# Altium footprint library standard.PcbLib: 235 footprints (part 11 of 15)
Each footprint in its own frame and in the unit in brackets; x right, y up, seen from the top. Pads: shape width x height; smd on the part's side, far side on the other; paste and mask are expansions set on the pad; w line width, h text height; cw(c..) or ccw(c..) is an arc to the next point about the centre after c.
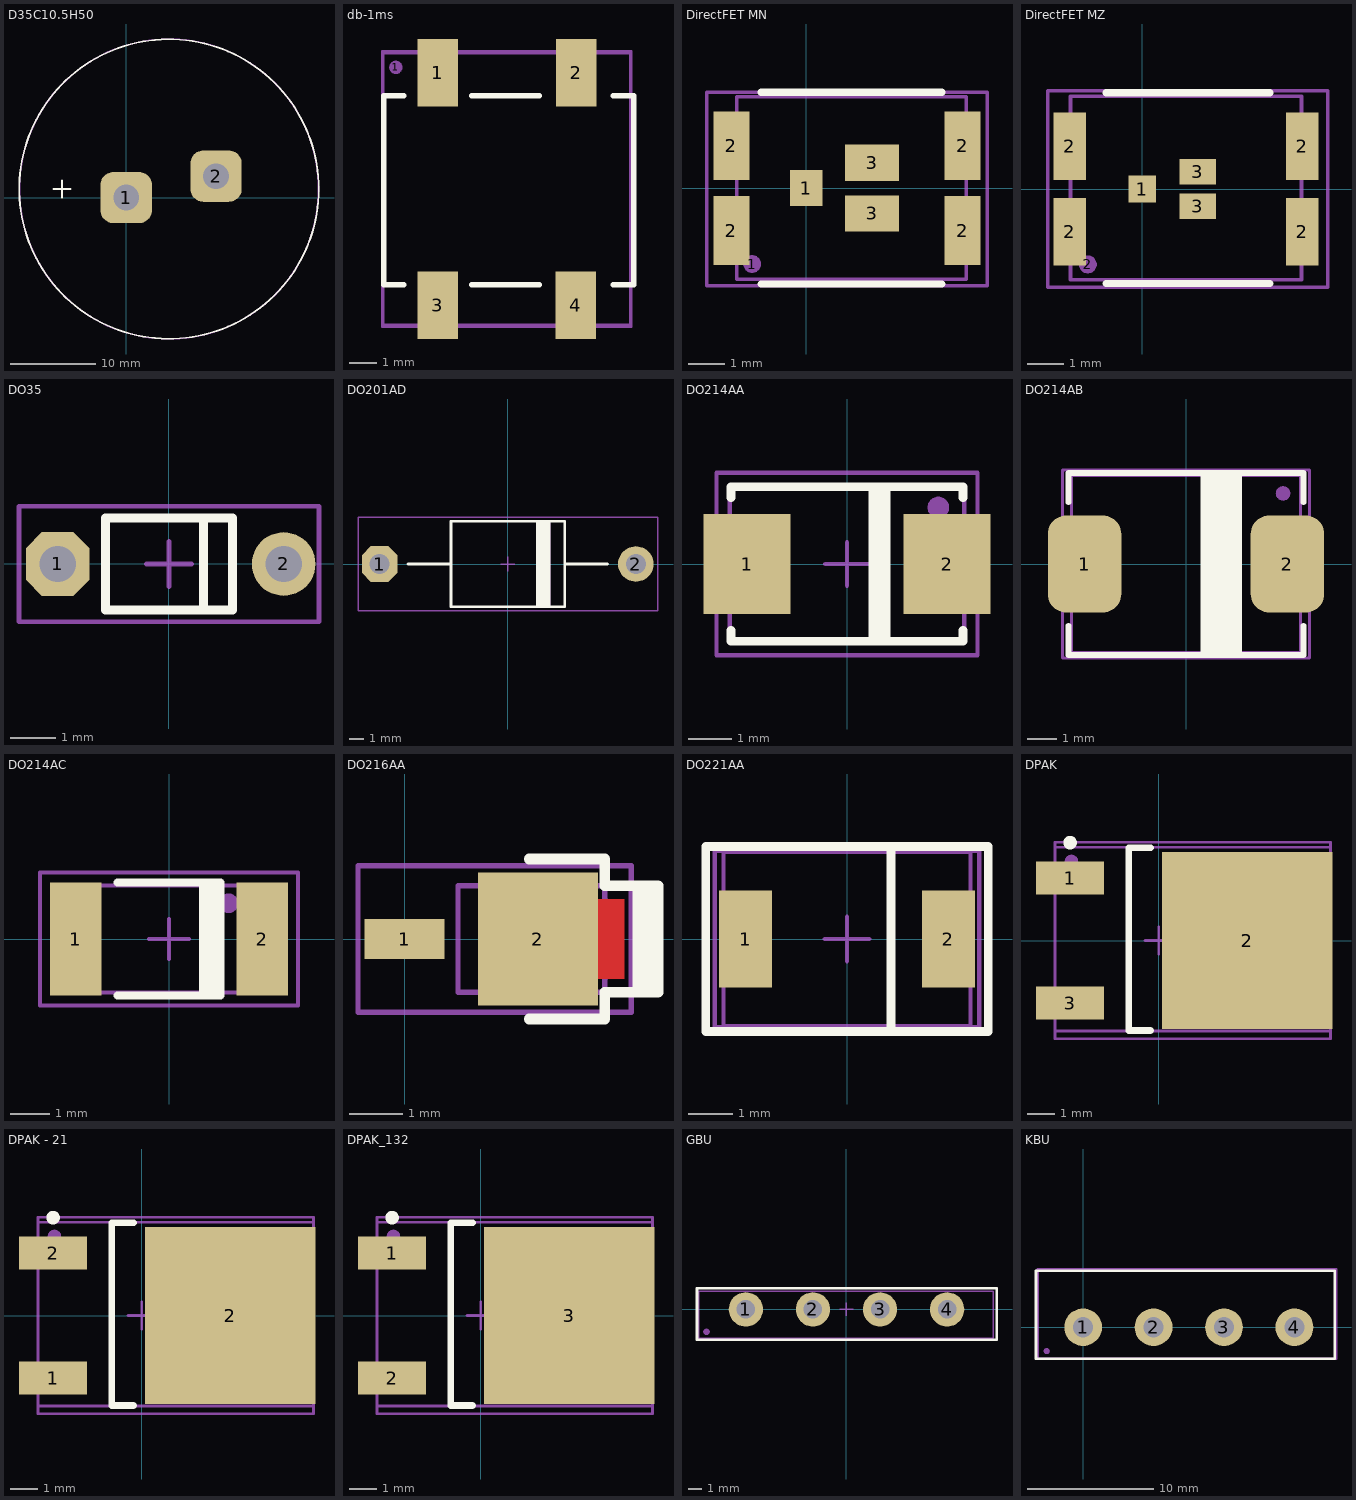
[diagram p10: the footprints below, top view; thin cyan lines are the x and y axes]

## D35C10.5H50 [mm]
height 50
pads (2):
  rrect50% 6x6 hole 3: 1(0,0) 2(10.5,2.5)
Top Overlay:
  circle w0.2: c5,1 r17.5
  lines w0.2: -8.5,1 -6.5,1 ; -7.5,0 -7.5,2
Mechanical 1:
  circle w0.1: c5,1 r17.464
  lines w0.1: -8.5,1 -6.5,1 ; -7.5,0 -7.5,2
Mechanical 15:
  circle w0.1: c5,1 r17.529
3D body "User Library-el_cap_470uF-400V.STEP": height 46.7, standoff -3.5, extent -15.756,-19.756 25.756,21.756

## db-1ms [mm]
pads (5):
  round 0.5 on Mech1: 1(3.2,-3.2)
  rect 1.5x2.5 smd: 1(4.75,-3.4) 2(9.875,-3.4) 3(4.75,-12) 4(9.85,-12)
Top Overlay:
  lines w0.2: 3.5,-11.25 2.75,-11.25 2.75,-4.25 3.5,-4.25 ; 6,-11.25 8.5,-11.25 ; 6,-4.25 8.5,-4.25 ; 11.25,-11.25 12,-11.25 12,-4.25 11.25,-4.25
Mechanical 1:
  lines w0.1: 2.725,-12.725 11.875,-12.725 11.875,-2.675 2.725,-2.675 2.725,-12.725
Mechanical 15:
  lines w0.1: 2.7,-12.8 2.7,-2.6 11.9,-2.6 11.9,-12.8 2.7,-12.8
3D body "User Library-DB-1S.STEP": height 3.4, standoff 0, extent 2.725,-12.725 11.875,-2.675

## DirectFET MN [mm]
pads (8):
  round 0.5 on Mech1: 1(-1.5,-2.1)
  rect 0.9x1 smd: 1(0,0)
  rect 1x1.9 smd: 2(-2.075,-1.175) 2(-2.075,1.175) 2(4.325,-1.175) 2(4.325,1.175)
  rect 1.5x1 smd: 3(1.82,-0.7) 3(1.82,0.7)
Top Overlay:
  lines w0.2: -1.25,-2.65 3.75,-2.65 ; -1.25,2.65 3.75,2.65
Mechanical 1:
  lines w0.1: -1.925,-2.525 -1.925,2.525 4.425,2.525 4.425,-2.525 -1.925,-2.525
Mechanical 15:
  lines w0.1: -2.75,-2.7 -2.75,2.65 5,2.65 5,-1.5 5,-2.7 -2.75,-2.7
3D body "User Library-DirectFET_MX.STEP": height 0.75, standoff 0, extent -1.925,-2.525 4.425,2.525

## DirectFET MZ [mm]
pads (8):
  rect 0.75x0.75 smd: 1(0,0)
  rrect0% 0.9x1.85 smd: 2(-2,-1.175) 2(-2,1.175) 2(4.4,-1.175) 2(4.4,1.175)
  round 0.5 on Mech1: 2(-1.5,-2.075)
  rect 1x0.7 smd: 3(1.525,-0.475) 3(1.525,0.475)
Top Overlay:
  lines w0.2: -1,-2.6 3.5,-2.6 ; -1,2.65 3.5,2.65
Mechanical 1:
  lines w0.1: -1.975,-2.5 -1.975,2.55 4.375,2.55 4.375,-2.5 -1.975,-2.5
Mechanical 15:
  lines w0.1: -2.6,-2.7 5,-2.7 5.1,-2.7 5.1,2.7 -2.6,2.7 -2.6,-2.7
3D body "User Library-DirectFET_MX.STEP": height 0.75, standoff 0, extent -1.975,-2.5 4.375,2.55

## DO35 [mm]
height 3
pads (2):
  oct 1.4x1.4 hole 0.8: 1(-2.45,0)
  round 1.4 hole 0.8: 2(2.525,0)
Top Overlay:
  lines w0.2: 0.762,-1.016 0.762,1.016 ; -1.397,-1.016 -1.397,1.016 1.397,1.016 1.397,-1.016 -1.397,-1.016
Mechanical 1:
  lines w0.1: 0.762,-1.016 0.762,1.016 ; -1.397,-1.016 1.397,-1.016 1.397,1.016 -1.397,1.016 -1.397,-1.016
Mechanical 15:
  lines w0.1: -0.5,0 0.5,0 ; 0,-0.5 0,0.5 ; -3.302,-1.27 -3.302,1.27 3.302,1.27 3.302,-1.27 -3.302,-1.27
3D body "DO-35.step": height 2.75, standoff -1.35, extent -2.7,-0.75 2.8,0.75

## DO201AD [mm] "Diode series 1N5400-1N5408"
height 5
pads (2):
  oct 2.5x2.5 hole 1.4: 1(-9,0)
  round 2.5 hole 1.4: 2(9,0)
Top Overlay:
  region: 2,3 2,-3 3,-3 3,3
  lines w0.2: -7,0 -4,0 ; 2,3 -4,3 ; 4,0 7,0 ; -4,3 -4,-3 4,-3 4,3 -4,3
Mechanical 1:
  region: 2,3 2,-3 3,-3 3,3
  lines w0.1: -7,0 -4,0 ; 2,3 -4,3 ; 4,0 7,0 ; -4,3 4,3 4,-3 -4,-3 -4,3
Mechanical 15:
  lines w0.1: -0.5,0 0.5,0 ; 0,-0.5 0,0.5 ; -10.524,-3.302 10.558,-3.302 10.558,3.302 -10.524,3.302 -10.524,-3.302
3D body "DO-201.STEP": height 6.8, standoff -2, extent -9.647,-2.85 9.647,2.75

## DO214AA [mm] "SMB"
height 4
pads (3):
  rect 2x2.3 smd: 1(-2.3,0) 2(2.3,0)
  round 0.5 on Mech1: ""(2.1,1.3)
Top Overlay:
  rectangle: 0.5,-1.778 1,1.778
  lines w0.2: -2.667,-1.524 -2.667,-1.778 2.667,-1.778 2.667,-1.524 ; -2.667,1.524 -2.667,1.778 2.667,1.778 2.667,1.524
Mechanical 1:
  lines w0.1: -2.7,-1.8 -2.7,1.8 2.7,1.8 2.7,-1.8 -2.7,-1.8
Mechanical 15:
  lines w0.1: -0.5,0 0.5,0 ; 0,-0.5 0,0.5 ; -3,-2.1 3,-2.1 3,2.1 -3,2.1 -3,-2.1
3D body "DO-214AA SMB.STEP": height 2.3, standoff 0, extent -2.7,-1.8 2.7,1.8

## DO214AB [mm] "SMC, Body 5.9x6.9mm"
height 2.5
pads (3):
  rrect50% 2.5x3.3 smd: 1(-3.45,0) 2(3.45,0)
  round 0.5 on Mech1: ""(3.3,2.4)
Top Overlay:
  rectangle: 0.5,-3 1.9,3.1
  lines w0.2: -4,-2.1 -4,-3.1 4,-3.1 4,-2.1 ; -4,2.1 -4,3.1 4,3.1 4,2.1
Mechanical 1:
  lines w0.1: -3.9,-3 3.9,-3 3.9,3 -3.9,3 -3.9,-3
Mechanical 15:
  lines w0.1: -4.2,-3.2 4.2,-3.2 4.2,3.2 -4.2,3.2 -4.2,-3.2
3D body "DO214AB.STEP": height 2.48, standoff 0.03, extent -3.9,-2.95 3.9,2.95

## DO214AC [mm] "SMA, MELF Diode, 2-Leads, Body 5,0x2,6mm, IPC Medium Density"
height 2.7
pads (3):
  rect 1.3x2.85 smd: 1(-2.35,0) 2(2.35,0)
  round 0.5 on Mech1: ""(1.5,0.9)
Top Overlay:
  rectangle: 0.75,-1.425 1.3,1.425
  lines w0.2: -1.3,-1.425 1.3,-1.425 1.3,1.425 -1.3,1.425
Mechanical 1:
  rectangle: 1.901,-1.35 2.6,1.35
  lines w0.1: -2.6,-1.35 -2.6,1.35 2.6,1.35 2.6,-1.35 -2.6,-1.35
Mechanical 15:
  lines w0.1: -0.5,0 0.5,0 ; 0,-0.5 0,0.5 ; -3.25,-1.675 -3.25,1.675 3.25,1.675 3.25,-1.675 -3.25,-1.675
3D body "DO-214AC(SMA).step": height 2.24, standoff -0.04, extent -2.743,-1.397 2.743,1.397

## DO216AA [mm] "Schottky Diode, 2-Leads, Body 2x2mm, 0.4W"
height 1
pads (3):
  rect 1.5x0.75 smd: 1(0,0)
  rect 2.25x2.5 smd: 2(2.5,0)
  round 0.5 on Mech1: ""(3.3,0.5)
Top Layer:
  rectangle: 3.625,-0.75 4.125,0.75
Top Overlay:
  rectangle: 4.275,-1 4.75,1
  lines w0.2: 2.337,-1.5 3.75,-1.5 3.75,-1 ; 2.337,1.5 3.75,1.5 3.75,1 ; 3.763,-1 4.725,-1 ; 3.763,1 4.725,1 ; 4.75,-1 4.75,1
Top Solder:
  rectangle: 3.725,-0.85 4.225,0.85
Mechanical 1:
  lines w0.1: 1,-1 1,1 3.75,1 3.75,0.75 4,0.5 4,-0.5 3.75,-0.75 3.75,-1 1,-1
Mechanical 15:
  lines w0.1: 1.85,0 2.85,0 ; 2.35,-0.5 2.35,0.5 ; -0.875,-1.375 4.25,-1.375 4.25,1.375 -0.875,1.375 -0.875,-1.375
3D body "DO216-AA.STEP": height 1.04, standoff 0.02, extent 0,-0.955 3.76,0.955

## DO221AA [mm]
pads (2):
  rect 1.2x2.2 smd: 1(-2.3,0) 2(2.3,0)
Top Overlay:
  lines w0.2: 1,-2.1 1,2.1 ; -3.2,-2.1 -3.2,2.1 3.2,2.1 3.2,-2.1 -3.2,-2.1
Mechanical 13:
  lines w0.1: 1,-1.975 1,1.975 ; -2.8,-1.975 -2.8,1.975 2.8,1.975 2.8,-1.975 -2.8,-1.975
Mechanical 15:
  lines w0.1: -0.5,0 0.5,0 ; 0,-0.5 0,0.5 ; -3,-2 3,-2 3,2 -3,2 -3,-2
3D body "DO-221AA.stp": height 1.1, standoff 0, extent -2.8,-1.975 2.8,1.975

## DPAK [mm] "D-Pak, Body 6,2x6,7mm"
height 2.4
pads (4):
  rect 2.5x1.2 smd: 1(-3.25,2.29) 3(-3.25,-2.29)
  rect 6.25x6.5 smd: 2(3.25,0)
  round 0.5 on Mech1: ""(-3.2,2.9)
Top Overlay:
  circle w0.25: c-3.25,3.59 r0.125
  lines w0.25: -0.3,-3.3 -1.1,-3.3 -1.1,3.4 -0.3,3.4
Mechanical 1:
  lines w0.1: -3.798,-3.317 6.302,-3.317 6.302,3.417 ; -3.798,-3.317 -3.798,-3.317 ; -3.798,-3.317 -3.798,3.417 6.302,3.417 ; 6.302,3.417 6.302,3.417
Mechanical 15:
  lines w0.1: -0.5,0 0.5,0 ; 0,-0.5 0,0.5 ; -3.8,-3.6 -3.8,3.6 6.3,3.6 6.3,-3.6 -3.8,-3.6
3D body "User Library-DPAK_TO-252AA.STEP": height 2.37, standoff -0.03, extent -3.798,-3.317 6.302,3.417

## DPAK - 21 [mm] "D-Pak, Body 6,2x6,7mm"
height 2.4
pads (4):
  rect 2.5x1.2 smd: 1(-3.25,-2.29) 2(-3.25,2.29)
  rect 6.25x6.5 smd: 2(3.25,0)
  round 0.5 on Mech1: ""(-3.2,2.9)
Top Overlay:
  circle w0.25: c-3.25,3.59 r0.125
  lines w0.25: -0.3,-3.3 -1.1,-3.3 -1.1,3.4 -0.3,3.4
Mechanical 1:
  lines w0.1: -3.798,-3.317 6.302,-3.317 6.302,3.417 ; -3.798,-3.317 -3.798,-3.317 ; -3.798,-3.317 -3.798,3.417 6.302,3.417 ; 6.302,3.417 6.302,3.417
Mechanical 15:
  lines w0.1: -0.5,0 0.5,0 ; 0,-0.5 0,0.5 ; -3.8,-3.6 -3.8,3.6 6.3,3.6 6.3,-3.6 -3.8,-3.6
3D body "User Library-DPAK_TO-252AA.STEP": height 2.37, standoff -0.03, extent -3.798,-3.317 6.302,3.417

## DPAK_132 [mm] "D-Pak, Body 6,2x6,7mm"
height 2.4
pads (4):
  rect 2.5x1.2 smd: 1(-3.25,2.29) 2(-3.25,-2.29)
  rect 6.25x6.5 smd: 3(3.25,0)
  round 0.5 on Mech1: ""(-3.2,2.9)
Top Overlay:
  circle w0.25: c-3.25,3.59 r0.125
  lines w0.25: -0.3,-3.3 -1.1,-3.3 -1.1,3.4 -0.3,3.4
Mechanical 1:
  lines w0.1: -3.798,-3.317 -3.798,3.417 6.302,3.417 ; -3.798,-3.317 -3.798,-3.317 ; -3.798,-3.317 6.302,-3.317 6.302,3.417 ; 6.302,3.417 6.302,3.417
Mechanical 15:
  lines w0.1: -0.5,0 0.5,0 ; 0,-0.5 0,0.5 ; -3.8,-3.6 6.3,-3.6 6.3,3.6 -3.8,3.6 -3.8,-3.6
3D body "User Library-DPAK_TO-252AA.STEP": height 2.37, standoff -0.03, extent -3.798,-3.317 6.302,3.417

## GBU [mm]
pads (5):
  round 2.6 hole 1.4: 1(-7.62,0) 2(-2.54,0) 3(2.54,0) 4(7.62,0)
  round 0.5 on Mech1: 2(-10.6,-1.7)
Top Overlay:
  lines w0.2: -11.32,-2.3 11.38,-2.3 11.38,1.6 -11.32,1.6 -11.32,-2.3
Mechanical 1:
  lines w0.1: -11.17,-2.2 11.13,-2.2 11.13,1.36 -11.17,1.36 -11.17,-2.2
Mechanical 15:
  lines w0.1: -0.5,0 0.5,0 ; 0,-0.5 0,0.5 ; -11.3,-2.3 11.4,-2.3 11.4,1.6 -11.3,1.6 -11.3,-2.3
3D body "User Library-GBU Vishay.STEP": height 25, standoff -11.55, extent -11.17,-2.2 11.13,1.36

## KBU [mm]
pads (5):
  round 3 hole 1.6: 1(0,0) 2(5.6,0) 3(11.2,0) 4(16.8,0)
  round 0.5 on Mech1: 3(-2.9,-1.9)
Top Overlay:
  lines w0.2: -3.75,-2.5 -3.75,4.5 20,4.5 20,-2.5 -3.75,-2.5
Mechanical 1:
  lines w0.2: -3.607,-2.5 -3.607,4.601 20.107,4.601 20.107,-2.5 -3.607,-2.5
Mechanical 15:
  lines w0.1: -3.7,-2.5 20.1,-2.5 20.1,4.6 -3.7,4.6 -3.7,-2.5
3D body "SW3dPS-KBU1010.STEP": height 26.96, standoff -20.74, extent -3.607,-2.5 20.107,4.601